# Altium footprint library General.PCBLIB: 130 footprints (part 6 of 9)
Each footprint in its own frame and in the unit in brackets; x right, y up, seen from the top. Pads: shape width x height; smd on the part's side, far side on the other; paste and mask are expansions set on the pad; w line width, h text height; cw(c..) or ccw(c..) is an arc to the next point about the centre after c.
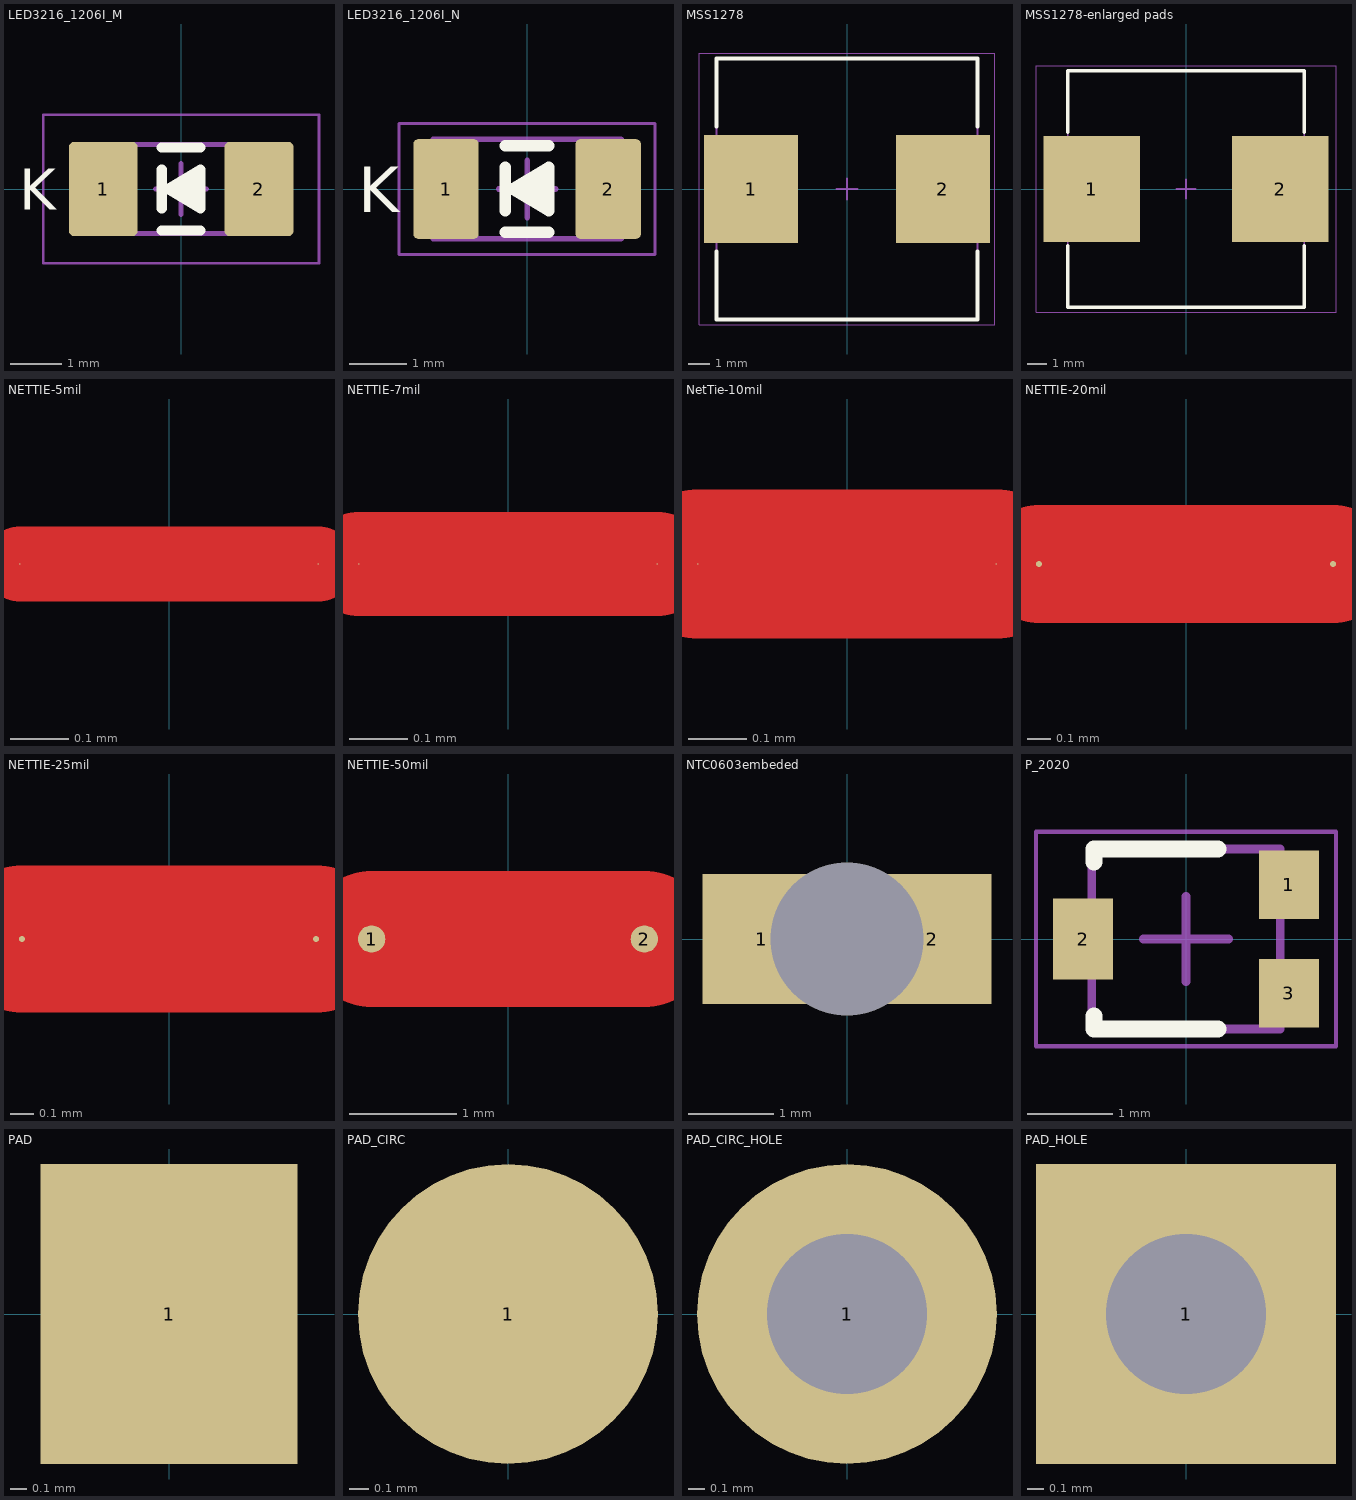
[diagram p5: the footprints below, top view; thin cyan lines are the x and y axes]

## LED3216_1206I_M [mm] "SMD LED, 2-Leads, Body 3.15x1.60mm, IPC Low Density"
height 0.6
pads (2):
  rrect15% 1.35x1.85 smd: 1(-1.525,0) 2(1.525,0)
Top Overlay:
  region: 0.381,-0.381 0.381,0.381 -0.381,0
  lines w0.2: -0.381,-0.813 0.381,-0.813 ; -0.381,-0.381 -0.381,0.381 ; -0.381,0.813 0.381,0.813 ; -0.254,0 0.381,-0.381 0.381,0.381 -0.254,0
  text "K" at -3.175,-0.406 h0.8
Top Body, 3D Models:
  lines w0.1: -1.65,-0.875 1.65,-0.875 1.65,0.875 -1.65,0.875 -1.65,-0.875
Top Courtyard:
  lines w0.05: -2.7,-1.45 2.7,-1.45 2.7,1.45 -2.7,1.45 -2.7,-1.45
  lines w0.1: -0.5,0 0.5,0 ; 0,-0.5 0,0.5
Top DesignatorDoc:
  text ".Designator" at 0,0 h1.2
3D body "STEP-WL-SMCW-1206-rev1.stp": height 0.68, standoff 0, extent -1.6,-0.8 1.6,0.8

## LED3216_1206I_N [mm] "SMD LED, 2-Leads, Body 3.15x1.60mm, IPC Medium Density"
height 0.6
pads (2):
  rrect15% 1.15x1.75 smd: 1(-1.425,0) 2(1.425,0)
Top Overlay:
  region: 0.381,-0.381 0.381,0.381 -0.381,0
  lines w0.2: -0.381,-0.762 0.381,-0.762 ; -0.381,-0.381 -0.381,0.381 ; -0.381,0.762 0.381,0.762 ; -0.254,0 0.381,-0.381 0.381,0.381 -0.254,0
  text "K" at -2.972,-0.406 h0.8
Top Body, 3D Models:
  lines w0.1: -1.65,-0.875 -1.65,0.875 1.65,0.875 1.65,-0.875 -1.65,-0.875
Top Courtyard:
  lines w0.05: -2.25,-1.15 -2.25,1.15 2.25,1.15 2.25,-1.15 -2.25,-1.15
  lines w0.1: -0.5,0 0.5,0 ; 0,-0.5 0,0.5
Top DesignatorDoc:
  text ".Designator" at 0,0 h1.2
3D body "STEP-WL-SMCW-1206-rev1.stp": height 0.68, standoff 0, extent -1.6,-0.8 1.6,0.8

## MSS1278 [mm] "Precision Wire Wound Inductor, 2-Leads, Body 12,15x12,15mm, IPC Medium Density"
height 8.05
pads (2):
  rect 4.45x5.1 smd: 1(-4.525,0) 2(4.525,0)
Top Overlay:
  lines w0.2: -6.15,-2.95 -6.15,-6.15 6.15,-6.15 6.15,-2.95 ; -6.15,2.95 -6.15,6.15 6.15,6.15 6.15,2.95
Top Body, 3D Models:
  lines w0.1: -6.15,-6.15 6.15,-6.15 6.15,6.15 -6.15,6.15 -6.15,-6.15
Top Courtyard:
  lines w0.05: -6.975,-6.4 6.975,-6.4 6.975,6.4 -6.975,6.4 -6.975,-6.4
  lines w0.1: -0.5,0 0.5,0 ; 0,-0.5 0,0.5
Top DesignatorDoc:
  text ".Designator" at 0,0 h1.2
3D body "Coilcraft-MSS1278.step": height 8.1, standoff 0.01, extent -6.15,-6.15 6.15,6.15

## MSS1278-enlarged pads [mm] "Precision Wire Wound Inductor, 2-Leads, Body 12,15x12,15mm, IPC NONE - Medium->Enlarged pads"
height 8.05
pads (2):
  rect 5x5.5 smd: 1(-4.9,0) 2(4.9,0)
Top Overlay:
  lines w0.2: -6.15,-2.95 -6.15,-6.15 6.15,-6.15 6.15,-2.95 ; -6.15,2.95 -6.15,6.15 6.15,6.15 6.15,2.95
Top Body, 3D Models:
  lines w0.1: -6.15,-6.15 -6.15,6.15 6.15,6.15 6.15,-6.15 -6.15,-6.15
Top Courtyard:
  lines w0.05: -7.8,-6.4 -7.8,6.4 7.8,6.4 7.8,-6.4 -7.8,-6.4
  lines w0.1: -0.5,0 0.5,0 ; 0,-0.5 0,0.5
Top DesignatorDoc:
  text ".Designator" at 0,0 h1.2
3D body "Coilcraft-MSS1278.step": height 8.1, standoff 0.01, extent -6.15,-6.15 6.15,6.15

## NETTIE-5mil [mil]
pads (2):
  round 0.1 smd paste-39.37 mask+0: 1(-10,0) 2(10,0)
Top Layer:
  lines w5: -10,0 10,0

## NETTIE-7mil [mil]
pads (2):
  round 0.1 smd paste-39.37 mask+0: 1(-10,0) 2(10,0)
Top Layer:
  lines w7: -10,0 10,0

## NetTie-10mil [mil]
pads (2):
  round 0.1 smd paste-39.37 mask+0: 1(-10,0) 2(10,0)
Top Layer:
  lines w10: -10,0 10,0

## NETTIE-20mil [mil]
pads (2):
  round 1 smd paste-39.37 mask+0: 1(-25,0) 2(25,0)
Top Layer:
  lines w20: -25,0 25,0

## NETTIE-25mil [mil]
pads (2):
  round 1 smd paste-39.37 mask+0: 1(-25,0) 2(25,0)
Top Layer:
  lines w25: -25,0 25,0

## NETTIE-50mil [mil]
pads (2):
  round 10 smd paste-39.37 mask+0: 1(-50,0) 2(50,0)
Top Layer:
  lines w50: -50,0 50,0

## NTC0603embeded [mm]
pads (3):
  rect 0x0 hole 1.8 unplated paste+0 mask+0.5: 0(0,0)
  rect 1.4x1.524 smd: 1(-1,0) 2(1,0)
Board Outline:
  lines w0.05: -1.016,-0.635 -1.016,0.635 ; 1.016,-0.635 1.016,0.635
  lines w0.051: -1.016,-0.635 1.016,-0.635 ; -1.016,0.635 1.016,0.635
Top DesignatorDoc:
  text ".Designator" at 0.127,1.016 h1.2
3D body "User Library-R_0603.step": height -0.09, standoff -0.99, extent -0.8,-0.25 0.8,0.25

## P_2020 [mm] "2x2mm SMD trimmer"
height 0.85
pads (3):
  rect 0.7x0.8 smd: 1(1.2,0.635) 3(1.2,-0.635)
  rect 0.7x0.95 smd: 2(-1.2,0)
Top Overlay:
  lines w0.2: -1.075,-0.9 -1.075,-1.05 0.375,-1.05 ; -1.075,0.9 -1.075,1.05 0.375,1.05
Top Body, 3D Models:
  lines w0.1: -1.1,-1.05 -1.1,1.05 1.1,1.05 1.1,-1.05 -1.1,-1.05
Top Courtyard:
  lines w0.05: -1.75,-1.25 -1.75,1.25 1.75,1.25 1.75,-1.25 -1.75,-1.25
  lines w0.1: -0.5,0 0.5,0 ; 0,-0.5 0,0.5
Top DesignatorDoc:
  text ".Designator" at 0,0 h1.2
3D body: height 0.85, standoff 0.01, extent -1.1,-1.05 1.1,1.05

## PAD [mil]
pads (1):
  rect 60x70 smd: 1(0,0)
Top DesignatorDoc:
  text ".Designator" at 40,0 h47.24

## PAD_CIRC [mil]
pads (1):
  round 60 smd: 1(0,0)
Top DesignatorDoc:
  text ".Designator" at 40,0 h47.24

## PAD_CIRC_HOLE [mil]
pads (1):
  round 74 hole 39.4: 1(0,0)
Top DesignatorDoc:
  text ".Designator" at 45,0 h47.24

## PAD_HOLE [mil]
pads (1):
  rect 74x74 hole 39.4: 1(0,0)
Top DesignatorDoc:
  text ".Designator" at 45,0 h47.24